# Altium footprint library Universal components.PcbLib: 101 footprints (part 5 of 7)
Each footprint in its own frame and in the unit in brackets; x right, y up, seen from the top. Pads: shape width x height; smd on the part's side, far side on the other; paste and mask are expansions set on the pad; w line width, h text height; cw(c..) or ccw(c..) is an arc to the next point about the centre after c.
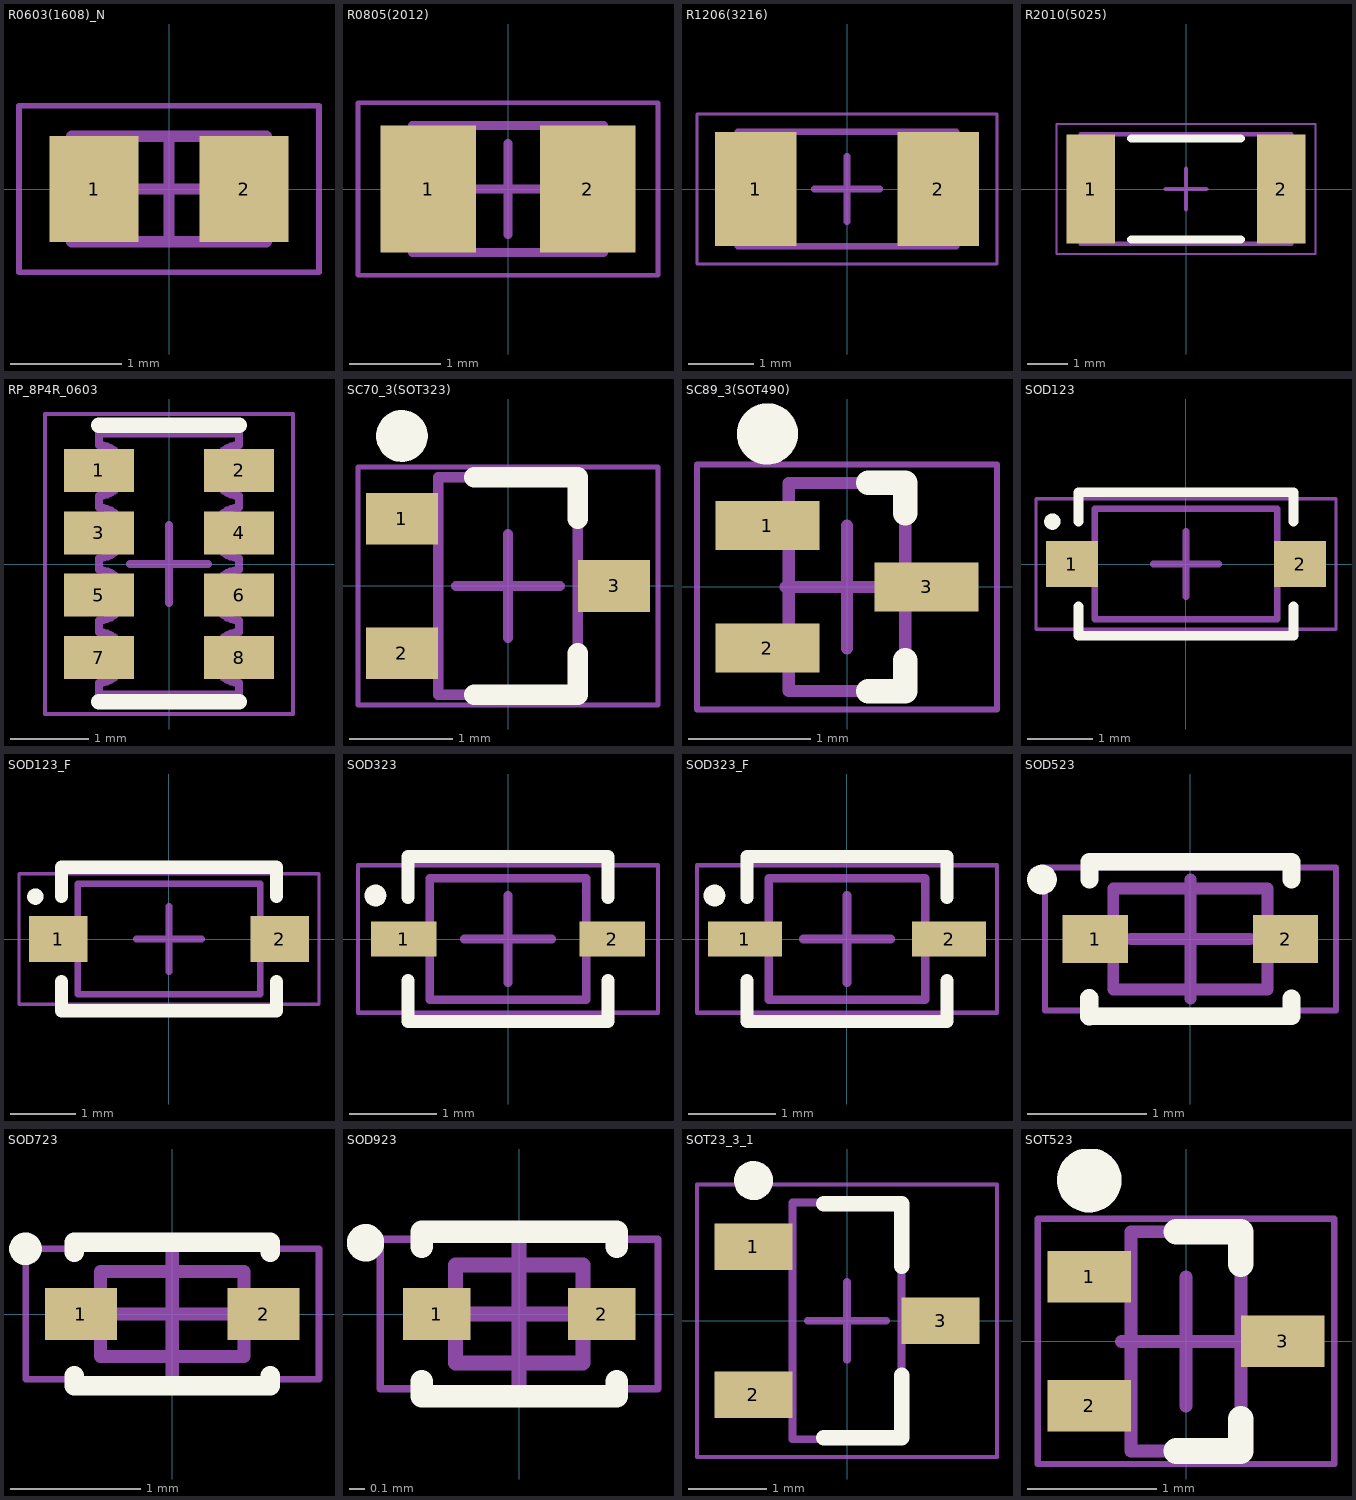
[diagram p4: the footprints below, top view; thin cyan lines are the x and y axes]

## R0603(1608)_N [mm] "Chip Resistor, 2-Leads, Body 1.60x0.80mm, IPC Medium Density"
height 0.5
pads (2):
  rect 0.8x0.95 smd: 1(-0.675,0) 2(0.675,0)
Mechanical 13:
  lines w0.1: -0.875,-0.475 -0.875,0.475 0.875,0.475 0.875,-0.475 -0.875,-0.475
Mechanical 15:
  lines w0.05: -1.35,-0.75 -1.35,0.75 1.35,0.75 1.35,-0.75 -1.35,-0.75
  lines w0.1: -0.475,0 0.475,0 ; 0,-0.475 0,0.475
3D body "R0603.STEP": height 0.45, standoff 0, extent -0.8,-0.4 0.8,0.4

## R0805(2012) [mm] "Chip Resistor, 2-Leads, Body 2.00x1.27mm, IPC Medium Density"
height 0.6
pads (2):
  rect 1.05x1.4 smd: 1(-0.875,0) 2(0.875,0)
Mechanical 13:
  lines w0.1: -1.05,-0.7 -1.05,0.7 1.05,0.7 1.05,-0.7 -1.05,-0.7
Mechanical 15:
  lines w0.05: -1.65,-0.95 -1.65,0.95 1.65,0.95 1.65,-0.95 -1.65,-0.95
  lines w0.1: -0.5,0 0.5,0 ; 0,-0.5 0,0.5
3D body "R0805.STEP": height 0.55, standoff 0, extent -1,-0.63 1,0.63

## R1206(3216) [mm] "Chip Resistor, 2-Leads, Body 3.20x1.60mm, IPC Medium Density"
height 0.65
pads (2):
  rect 1.25x1.75 smd: 1(-1.4,0) 2(1.4,0)
Mechanical 13:
  lines w0.1: -1.675,-0.875 -1.675,0.875 1.675,0.875 1.675,-0.875 -1.675,-0.875
Mechanical 15:
  lines w0.05: -2.3,-1.15 -2.3,1.15 2.3,1.15 2.3,-1.15 -2.3,-1.15
  lines w0.1: -0.5,0 0.5,0 ; 0,-0.5 0,0.5
3D body "R1206.STEP": height 0.6, standoff 0, extent -1.6,-0.8 1.6,0.8

## R2010(5025) [mm] "Chip Resistor, 2-Leads, Body 5.00x2.50mm, IPC Medium Density"
height 0.65
pads (2):
  rect 1.2x2.7 smd: 1(-2.35,0) 2(2.35,0)
Top Overlay:
  lines w0.2: -1.35,-1.25 1.35,-1.25 ; -1.35,1.25 1.35,1.25
Mechanical 13:
  lines w0.1: -2.6,-1.35 2.6,-1.35 2.6,1.35 -2.6,1.35 -2.6,-1.35
Mechanical 15:
  lines w0.05: -3.2,-1.6 3.2,-1.6 3.2,1.6 -3.2,1.6 -3.2,-1.6
  lines w0.1: -0.5,0 0.5,0 ; 0,-0.5 0,0.5
3D body: height 0.65, standoff 0, extent 2.05,-1.35 2.6,1.35
3D body: height 0.65, standoff 0, extent -2.6,-1.35 -2.05,1.35
3D body: height 0.65, standoff 0, extent -2.05,-1.35 2.05,1.35

## RP_8P4R_0603 [mm] "Chip Array, Concave, 8-Leads, Pitch 0.80mm,  Body 3.20x1.60mm,  IPC Medium Density"
height 0.6
pads (8):
  rect 0.9x0.55 smd: 1(-0.9,1.2) 2(0.9,1.2) 3(-0.9,0.4) 4(0.9,0.4) 5(-0.9,-0.4) 6(0.9,-0.4) 7(-0.9,-1.2) 8(0.9,-1.2)
Top Overlay:
  lines w0.2: -0.9,-1.77 0.9,-1.77 ; -0.9,1.78 0.9,1.78
Mechanical 13:
  lines w0.1: -0.9,-1.675 -0.9,-1.525 ccw(c-0.9,-1.2) -0.9,-0.875 -0.9,-0.725 ccw(c-0.9,-0.4) -0.9,-0.075 -0.9,0.075 ccw(c-0.9,0.4) -0.9,0.725 -0.9,0.875 ccw(c-0.9,1.2) -0.9,1.525 -0.9,1.675 0.9,1.675 0.9,1.525 ccw(c0.9,1.2) 0.9,0.875 0.9,0.725 ccw(c0.9,0.4) 0.9,0.075 0.9,-0.075 ccw(c0.9,-0.4) 0.9,-0.725 0.9,-0.875 ccw(c0.9,-1.2) 0.9,-1.525 0.9,-1.675 -0.9,-1.675
Mechanical 15:
  lines w0.05: -1.59,-1.925 -1.59,1.925 1.59,1.925 1.59,-1.925 -1.59,-1.925
  lines w0.1: -0.5,0 0.5,0 ; 0,-0.5 0,0.5
3D body "68422.stp": height 0.24, standoff -0.26, extent -0.8,-1.6 0.8,1.6

## SC70_3(SOT323) [mm] "SOT23, 3-Leads, Body 2.00x2.20mm, Pitch 0.65mm, IPC High Density"
height 1.1
pads (3):
  rect 0.7x0.5 smd: 1(-1.025,0.65) 2(-1.025,-0.65) 3(1.025,0)
Top Overlay:
  circle w0.25: c-1.025,1.45 r0.125
  lines w0.2: -0.325,-1.05 0.675,-1.05 0.675,-0.65 ; -0.325,1.05 0.675,1.05 0.675,0.65
Mechanical 13:
  lines w0.1: -0.675,-1.05 -0.675,1.05 0.675,1.05 0.675,-1.05 -0.675,-1.05
Mechanical 15:
  lines w0.05: -1.45,-1.15 -1.45,1.15 1.45,1.15 1.45,-1.15 -1.45,-1.15
  lines w0.1: -0.5,0 0.5,0 ; 0,-0.5 0,0.5
3D body "User Library-SOT323 (SC70-3)-1.STEP": height 1.1, standoff 0, extent -1.122,-1.1 1.123,1.1

## SC89_3(SOT490) [mm] "SOTFL, 3-Leads, Body 1.60x1.60mm, Pitch 0.50mm, IPC Medium Density"
height 0.8
pads (3):
  rect 0.85x0.4 smd: 1(-0.65,0.5) 2(-0.65,-0.5) 3(0.65,0)
Top Overlay:
  circle w0.25: c-0.65,1.25 r0.125
  lines w0.2: 0.175,-0.85 0.475,-0.85 0.475,-0.6 ; 0.175,0.85 0.475,0.85 0.475,0.6
Mechanical 13:
  lines w0.1: -0.475,-0.85 -0.475,0.85 0.475,0.85 0.475,-0.85 -0.475,-0.85
Mechanical 15:
  lines w0.05: -1.225,-1 -1.225,1 1.225,1 1.225,-1 -1.225,-1
  lines w0.1: -0.5,0 0.5,0 ; 0,-0.5 0,0.5
3D body "User Library-FDY102PZ.step": height 0.78, standoff 0, extent -0.85,-0.85 0.85,0.85

## SOD123 [mm] "SODFL, 2-Leads, Body 1.60x3.70mm, IPC Medium Density"
height 1.25
pads (2):
  rect 0.8x0.7 smd: 1(-1.75,0) 2(1.75,0)
Top Overlay:
  circle w0.15: c-2.05,0.65 r0.05
  lines w0.15: -1.65,-0.65 -1.65,-1.1 1.65,-1.1 1.65,-0.65 ; -1.65,0.65 -1.65,1.1 1.65,1.1 1.65,0.65
Mechanical 13:
  lines w0.1: -1.4,-0.85 -1.4,0.85 1.4,0.85 1.4,-0.85 -1.4,-0.85
Mechanical 15:
  lines w0.05: -2.3,-1 -2.3,1 2.3,1 2.3,-1 -2.3,-1
  lines w0.1: -0.5,0 0.5,0 ; 0,-0.5 0,0.5
3D body "User Library-SOD123.step": height 1.27, standoff 0, extent -1.85,-0.8 1.85,0.8

## SOD123_F [mm] "SODFL, 2-Leads, Body 1.60x3.70mm, IPC Medium Density"
height 1.25
pads (2):
  rect 0.9x0.7 smd: 1(-1.7,0) 2(1.7,0)
Top Overlay:
  circle w0.15: c-2.05,0.65 r0.05
  lines w0.2: -1.65,-0.65 -1.65,-1.1 1.65,-1.1 1.65,-0.65 ; -1.65,0.65 -1.65,1.1 1.65,1.1 1.65,0.65
Mechanical 13:
  lines w0.1: -1.4,-0.85 -1.4,0.85 1.4,0.85 1.4,-0.85 -1.4,-0.85
Mechanical 15:
  lines w0.05: -2.3,-1 -2.3,1 2.3,1 2.3,-1 -2.3,-1
  lines w0.1: -0.5,0 0.5,0 ; 0,-0.5 0,0.5
3D body "User Library-SOD123F.step": height 1.2, standoff -0.01, extent -1.9,-0.85 1.85,0.85

## SOD323 [mm] "SODFL, 2-Leads, Body 1.30x2.60mm, IPC Medium Density"
height 1
pads (2):
  rect 0.75x0.4 smd: 1(-1.2,0) 2(1.2,0)
Top Overlay:
  circle w0.15: c-1.525,0.5 r0.05
  lines w0.15: -1.15,-0.475 -1.15,-0.95 1.15,-0.95 1.15,-0.475 ; -1.15,0.475 -1.15,0.95 1.15,0.95 1.15,0.475
Mechanical 13:
  lines w0.1: -0.9,-0.7 0.9,-0.7 0.9,0.7 -0.9,0.7 -0.9,-0.7
Mechanical 15:
  lines w0.05: -1.725,-0.85 1.725,-0.85 1.725,0.85 -1.725,0.85 -1.725,-0.85
  lines w0.1: -0.5,0 0.5,0 ; 0,-0.5 0,0.5
3D body "User Library-SOD323.step": height 0.9, standoff -0.09, extent -1.25,-0.63 1.25,0.62

## SOD323_F [mm] "SODFL, 2-Leads, Body 1.30x2.60mm, IPC Medium Density"
height 1
pads (2):
  rect 0.85x0.4 smd: 1(-1.175,0) 2(1.175,0)
Top Overlay:
  circle w0.15: c-1.525,0.5 r0.05
  lines w0.15: -1.15,-0.475 -1.15,-0.95 1.15,-0.95 1.15,-0.475 ; -1.15,0.475 -1.15,0.95 1.15,0.95 1.15,0.475
Mechanical 13:
  lines w0.1: -0.9,-0.7 -0.9,0.7 0.9,0.7 0.9,-0.7 -0.9,-0.7
Mechanical 15:
  lines w0.05: -1.725,-0.85 -1.725,0.85 1.725,0.85 1.725,-0.85 -1.725,-0.85
  lines w0.1: -0.5,0 0.5,0 ; 0,-0.5 0,0.5
3D body "User Library-SOD323F.step": height 0.75, standoff -0.01, extent -1.4,-0.675 1.4,0.675

## SOD523 [mm] "SODFL, 2-Leads, Body 0.80x1.60mm, IPC Medium Density"
height 0.77
pads (2):
  rect 0.55x0.4 smd: 1(-0.8,0) 2(0.8,0)
Top Overlay:
  circle w0.15: c-1.25,0.5 r0.05
  lines w0.15: -0.85,-0.65 0.85,-0.65 0.85,-0.5 ; -0.85,0.5 -0.85,0.65 0.85,0.65 0.85,0.5
  lines w0.156: -0.85,-0.65 -0.85,-0.5
Mechanical 13:
  lines w0.1: -0.65,-0.425 0.65,-0.425 0.65,0.425 -0.65,0.425 -0.65,-0.425
Mechanical 15:
  lines w0.05: -1.225,-0.6 1.225,-0.6 1.225,0.6 -1.225,0.6 -1.225,-0.6
  lines w0.1: -0.5,0 0.5,0 ; 0,-0.5 0,0.5
3D body "User Library-SOD523-1.step": height 0.7, standoff 0, extent -0.8,-0.399 0.8,0.399

## SOD723 [mm] "SODFL, 2-Leads, Body 0.60x1.40mm, IPC Medium Density"
height 0.65
pads (2):
  rect 0.55x0.4 smd: 1(-0.7,0) 2(0.7,0)
Top Overlay:
  circle w0.15: c-1.125,0.5 r0.05
  lines w0.15: -0.75,-0.475 -0.75,-0.55 0.75,-0.55 0.75,-0.475 ; -0.75,0.475 -0.75,0.55 0.75,0.55 0.75,0.475
Mechanical 13:
  lines w0.1: -0.55,-0.325 0.55,-0.325 0.55,0.325 -0.55,0.325 -0.55,-0.325
Mechanical 15:
  lines w0.05: -1.125,-0.5 1.125,-0.5 1.125,0.5 -1.125,0.5 -1.125,-0.5
  lines w0.1: -0.5,0 0.5,0 ; 0,-0.5 0,0.5
3D body "rsb6_8gt2r.stp": height 0.49, standoff -0.01, extent -0.7,-0.3 0.7,0.3

## SOD923 [mm] "SODFL, 2-Leads, Body 0.60x1.00mm, IPC Medium Density"
height 0.43
pads (2):
  rect 0.45x0.35 smd: 1(-0.55,0) 2(0.55,0)
Top Overlay:
  circle w0.15: c-1.025,0.475 r0.05
  lines w0.15: -0.65,-0.45 -0.65,-0.55 0.65,-0.55 0.65,-0.45 ; -0.65,0.45 -0.65,0.55 0.65,0.55 0.65,0.45
Mechanical 13:
  lines w0.1: -0.425,-0.325 -0.425,0.325 0.425,0.325 0.425,-0.325 -0.425,-0.325
Mechanical 15:
  lines w0.05: -0.925,-0.5 -0.925,0.5 0.925,0.5 0.925,-0.5 -0.925,-0.5
  lines w0.1: -0.5,0 0.5,0 ; 0,-0.5 0,0.5
3D body "User Library-DIODE_SOD-923.step": height 0.43, standoff 0, extent -0.525,-0.325 0.525,0.325

## SOT23_3_1 [mm] "SOT23, 3-Leads, Body 2.92x2.37mm, Pitch 0.95mm, IPC Medium Density"
height 0.89
pads (3):
  rect 1x0.6 smd: 1(-1.2,0.95) 2(-1.2,-0.95) 3(1.2,0)
Top Overlay:
  circle w0.25: c-1.2,1.8 r0.125
  lines w0.2: -0.3,-1.5 0.7,-1.5 0.7,-0.7 ; -0.3,1.5 0.7,1.5 0.7,0.7
Mechanical 13:
  lines w0.1: -0.7,-1.52 -0.7,1.52 0.7,1.52 0.7,-1.52 -0.7,-1.52
Mechanical 15:
  lines w0.05: -1.925,-1.75 -1.925,1.75 1.925,1.75 1.925,-1.75 -1.925,-1.75
  lines w0.1: -0.5,0 0.5,0 ; 0,-0.5 0,0.5
3D body "SOT-23.step": height 1.3, standoff 0, extent -1.5,-1.5 1.5,1.5

## SOT523 [mm] "SOT23, 3-Leads, Body 1.60x1.60mm, Pitch 0.50mm, IPC High Density"
height 0.9
pads (3):
  rect 0.65x0.4 smd: 1(-0.75,0.5) 2(-0.75,-0.5) 3(0.75,0)
Top Overlay:
  circle w0.25: c-0.75,1.25 r0.125
  lines w0.2: -0.075,-0.85 0.425,-0.85 0.425,-0.6 ; -0.075,0.85 0.425,0.85 0.425,0.6
Mechanical 13:
  lines w0.1: -0.425,-0.85 0.425,-0.85 0.425,0.85 -0.425,0.85 -0.425,-0.85
Mechanical 15:
  lines w0.05: -1.15,-0.95 1.15,-0.95 1.15,0.95 -1.15,0.95 -1.15,-0.95
  lines w0.1: -0.5,0 0.5,0 ; 0,-0.5 0,0.5
3D body "User Library-SOT-523.step": height 0.8, standoff 0, extent -0.8,-0.8 0.8,0.8